# Altium footprint library PcbLib1.PcbLib: 1009 footprints (part 52 of 64)
Each footprint in its own frame and in the unit in brackets; x right, y up, seen from the top. Pads: shape width x height; smd on the part's side, far side on the other; paste and mask are expansions set on the pad; w line width, h text height; cw(c..) or ccw(c..) is an arc to the next point about the centre after c.
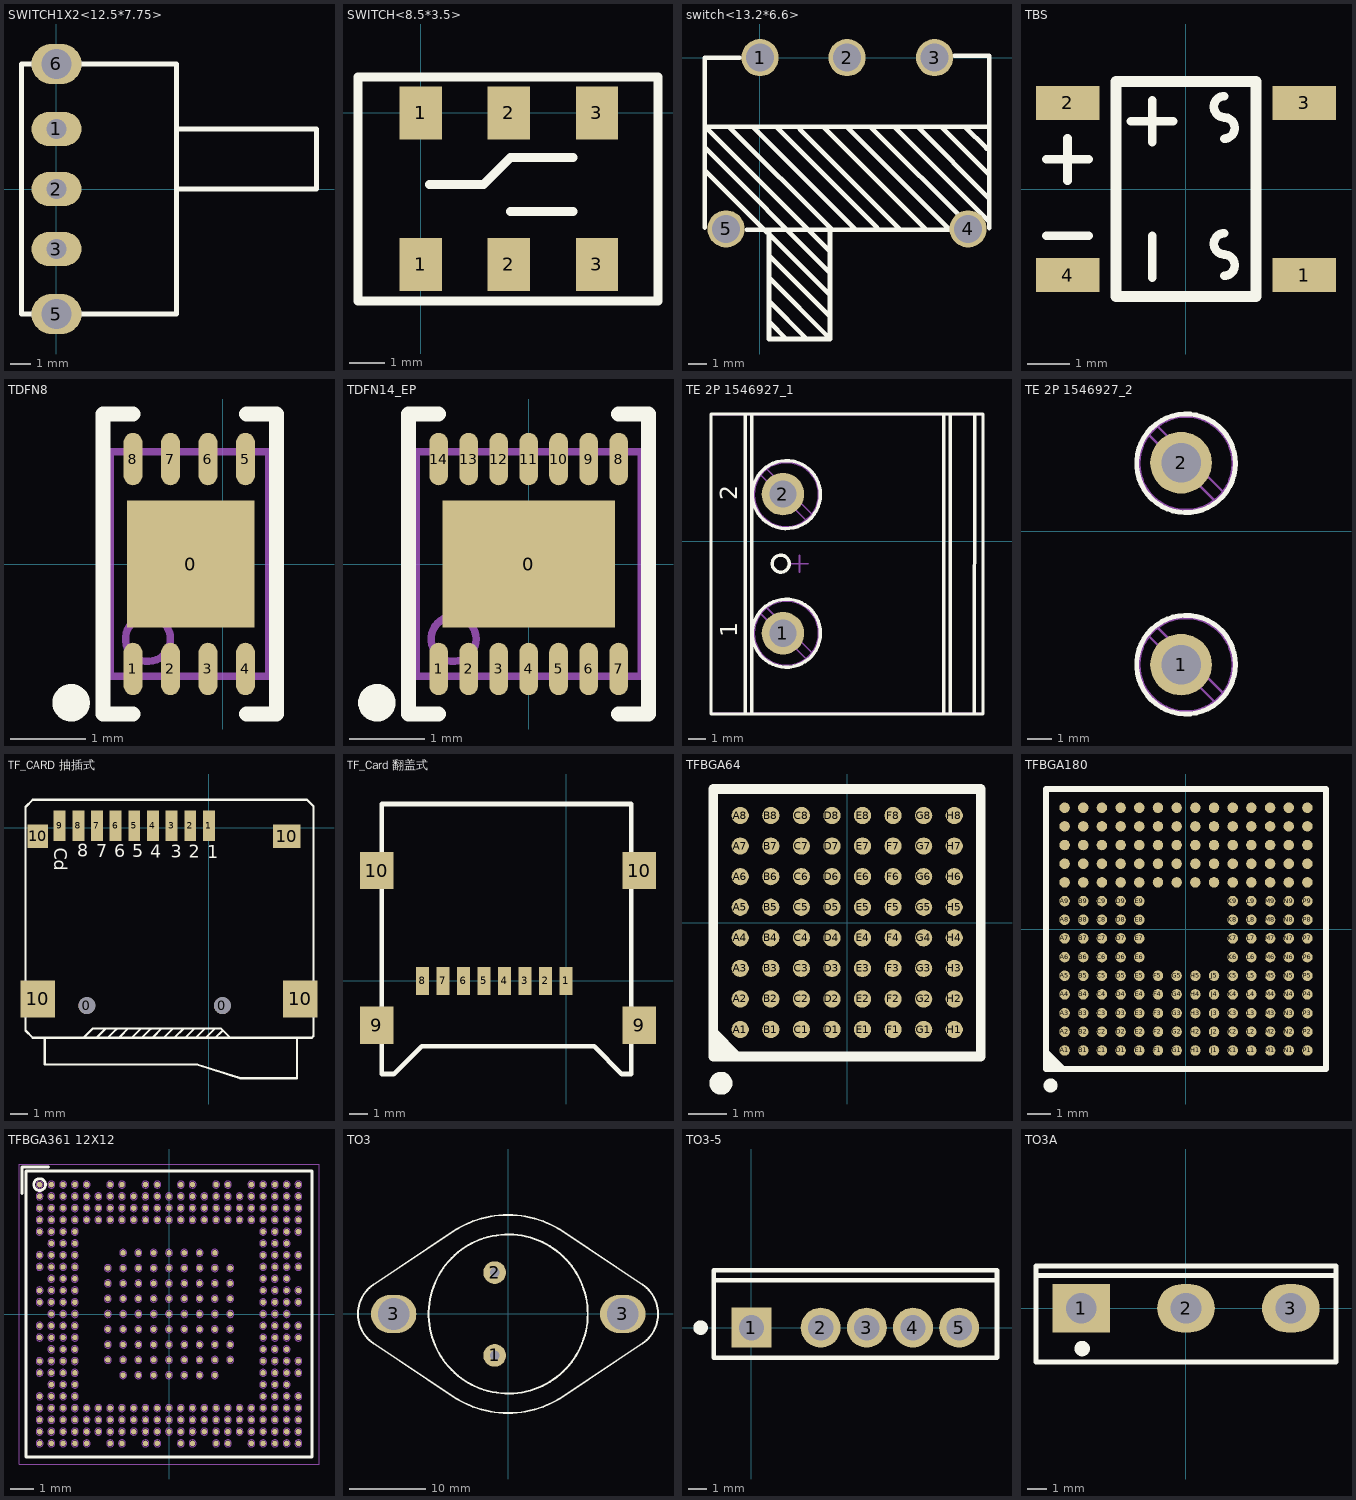
[diagram p51: the footprints below, top view; thin cyan lines are the x and y axes]

## SWITCH1X2<12.5*7.75> [mm]
pads (5):
  oval 2.5x1.7 hole 1: 1(0,3) 2(0,0) 3(0,-3)
  oval 2.5x2 hole 1.5: 5(0,-6.25) 6(0,6.25)
Top Overlay:
  lines w0.254: 6,0 13,0 13,3 6,3 ; -1.75,-6.25 0,-6.25 6,-6.25 6,6.25 0,6.25 -1.5,6.25 -1.75,6.25 -1.75,-6.25
3D body "User Library-SLIDE SWITCH SS12F23.STEP": height 5.75, standoff -3.35, extent -0.608,-6.523 12.292,6.477

## SWITCH<8.5*3.5> [mm]
pads (6):
  rect 1.2x1.5 smd mask+0.051: 1(0,-4.3) 1(0,0) 2(2.5,-4.3) 2(2.5,0) 3(5,-4.3) 3(5,0)
Top Overlay:
  lines w0.254: 0.254,-2.032 1.778,-2.032 2.54,-1.27 4.318,-1.27 ; 2.54,-2.794 4.318,-2.794 ; -1.778,-5.334 -1.778,1.016 6.731,1.016 6.731,-4.826 6.731,-5.334 -1.778,-5.334

## switch<13.2*6.6> [mm]
pads (5):
  round 2 hole 1.5 mask+0.051: 1(0.025,0) 2(4.7,0) 3(9.4,0) 4(11.2,-9.2) 5(-1.8,-9.2)
Top Overlay:
  lines w0.254: -2.946,-9.119 -2.946,0 -1.067,0 ; -2.946,-4.826 3.772,-11.544 ; -2.921,-6.071 3.785,-12.776 ; -2.908,-3.708 3.753,-10.37 ; -2.896,-3.708 12.339,-3.708 12.288,-3.759 ; -1.642,-3.708 3.865,-9.216 ; -0.686,-9.246 10.189,-9.246 ; -0.376,-3.708 5.136,-9.22 ; 0.508,-14.199 1.422,-15.113 ; 0.508,-11.659 0.508,-11.836 3.785,-15.113 ; 0.508,-10.592 0.508,-10.643 3.785,-13.919 ; 0.508,-9.271 0.508,-15.113 3.785,-15.113 ; 0.521,-13.094 2.54,-15.113 ; 0.891,-3.708 6.326,-9.144 ; 2.157,-3.835 7.567,-9.246 ; 3.424,-3.708 8.935,-9.22 ; 3.785,-9.296 3.785,-15.113 ; 4.69,-3.708 10.189,-9.207 ; 5.956,-3.708 11.341,-9.093 ; 7.223,-3.708 12.286,-8.771 ; 8.489,-3.708 12.322,-7.541 ; 9.756,-3.708 12.245,-6.198 ; 10.465,0.102 12.334,0.102 12.339,0.096 12.339,-9.149 ; 11.022,-3.708 12.19,-4.877

## TBS [mm]
pads (4):
  rect 1.5x0.8 smd: 1(2.794,-2.032) 2(-2.794,2.032) 3(2.794,2.032) 4(-2.794,-2.032)
Top Overlay:
  lines w0.203: -3.3,-1.1 -2.3,-1.1 ; -3.3,0.7 -2.3,0.7 ; -2.8,0.2 -2.8,1.2 ; -1.3,1.6 -0.3,1.6 ; -0.8,-2.1 -0.8,-1.1 ; -0.8,1.1 -0.8,2.1 ; 0.9,-2.05 ccw(c0.9,-1.8) 0.9,-1.55 ; 0.9,1.19 ccw(c0.9,1.44) 0.9,1.69 ; 0.908,-1.545 cw(c0.908,-1.295) 0.908,-1.045 ; 0.908,1.695 cw(c0.908,1.945) 0.908,2.195
  lines w0.254: -1.651,-2.54 1.651,-2.54 1.651,2.54 -1.651,2.54 -1.651,-2.54

## TDFN8 [mm]
pads (9):
  rect 1.7x1.7 smd mask+0.051: 0(-0.432,0)
  oval 0.25x0.7 smd mask+0.051: 1(-1.2,-1.4) 2(-0.7,-1.4) 3(-0.2,-1.4) 4(0.3,-1.4) 5(0.3,1.4) 6(-0.2,1.4) 7(-0.7,1.4) 8(-1.2,1.4)
Top Overlay:
  circle w0.25: c-2.025,-1.85 r0.125
  lines w0.2: -1.2,-2 -1.6,-2 -1.6,2 -1.2,2 ; 0.311,-2 0.711,-2 0.711,2 0.311,2
Mechanical 13:
  circle w0.1: c-1,-1 r0.3
  lines w0.1: -1.5,-1.5 0.61,-1.5 0.61,1.5 -1.5,1.5 -1.5,-1.5
3D body "User Library-TDFN-8-1.STEP": height 0.8, standoff 0, extent -1.441,-1.5 0.559,1.5

## TDFN14_EP [mm]
pads (15):
  rect 2.3x1.7 smd mask+0.051: 0(0,0)
  oval 0.25x0.7 smd mask+0.051: 1(-1.2,-1.4) 2(-0.8,-1.4) 3(-0.4,-1.4) 4(0,-1.4) 5(0.4,-1.4) 6(0.8,-1.4) 7(1.2,-1.4) 8(1.2,1.4) 9(0.8,1.4) 10(0.4,1.4) 11(0,1.4) 12(-0.4,1.4) 13(-0.8,1.4) 14(-1.2,1.4)
Top Overlay:
  circle w0.25: c-2.025,-1.85 r0.125
  lines w0.2: -1.2,-2 -1.6,-2 -1.6,2 -1.2,2 ; 1.2,-2 1.6,-2 1.6,2 1.2,2
Mechanical 13:
  circle w0.1: c-1,-1 r0.3
  lines w0.1: -1.5,-1.5 1.5,-1.5 1.5,1.5 -1.5,1.5 -1.5,-1.5

## TE 2P 1546927_1 [mm]
pads (2):
  round 2.5 hole 1.6: 1(10.617,-5.41) 2(10.617,2.769)
Top Overlay:
  circle w0.2: c10.482,-1.321 r0.5
  circle w0.2: c10.817,-5.41 r2
  circle w0.2: c10.817,2.743 r2
  lines w0.2: 6.382,-10.16 6.382,7.48 22.377,7.48 ; 6.401,-10.16 22.38,-10.16 22.38,7.48 ; 8.403,-10.16 8.407,7.468 ; 8.784,-10.135 8.784,7.468 ; 20.063,-10.109 20.063,7.468 ; 20.447,-10.135 20.454,7.468 ; 21.869,-10.135 21.883,7.442
  text "2" at 7.938,2.4 h1
  text "1" at 7.938,-5.645 h1
Mechanical 8:
  lines w0.1: 10.117,-5.41 10.617,-5.41 ; 10.117,2.743 10.617,2.743 ; 10.617,-5.91 10.617,-5.41 ; 10.617,-4.91 10.617,-5.41 ; 10.617,2.243 10.617,2.743 ; 10.617,3.243 10.617,2.743 ; 11.082,-1.321 11.582,-1.321 ; 11.117,-5.41 10.617,-5.41 ; 11.117,2.743 10.617,2.743 ; 11.582,-1.821 11.582,-1.321 ; 11.582,-0.821 11.582,-1.321 ; 12.082,-1.321 11.582,-1.321
Mechanical 14:
  circle w0.1: c10.817,2.743 r2
  circle w0.1: c10.817,-5.41 r2
  circle w0.1: c10.482,-1.321 r0.5
  circle w0.1: c10.817,2.743 r1.891
  circle w0.1: c10.817,-5.41 r1.891
  lines w0.1: 6.382,-10.109 6.382,7.442 22.377,7.442 ; 6.401,-10.109 22.38,-10.109 22.38,7.442 ; 8.403,-10.084 8.407,7.417 ; 8.783,-10.084 8.788,7.442 ; 9.315,-4.261 11.966,-6.913 ; 9.315,3.892 11.966,1.241 ; 9.668,-3.908 12.32,-6.559 ; 9.668,4.246 12.32,1.594 ; 20.063,-10.16 20.063,7.417 ; 20.447,7.417 20.454,-10.135 ; 21.869,7.417 21.883,-10.16
  text "2" at 7.938,2.4 h1
  text "1" at 7.938,-5.645 h1
3D body "c-1546927-2-a-3d.stp": height 14.99, standoff -5.08, extent 6.375,-10.198 22.435,7.506

## TE 2P 1546927_2 [mm]
pads (2):
  round 2.5 hole 1.6: 1(10.617,-5.41) 2(10.617,2.769)
Top Overlay:
  circle w0.2: c10.817,-5.41 r2
  circle w0.2: c10.817,2.743 r2
Mechanical 8:
  lines w0.1: 10.117,-5.41 10.617,-5.41 ; 10.117,2.743 10.617,2.743 ; 10.617,-5.91 10.617,-5.41 ; 10.617,-4.91 10.617,-5.41 ; 10.617,2.243 10.617,2.743 ; 10.617,3.243 10.617,2.743 ; 11.117,-5.41 10.617,-5.41 ; 11.117,2.743 10.617,2.743
Mechanical 14:
  circle w0.1: c10.817,2.743 r2
  circle w0.1: c10.817,-5.41 r2
  circle w0.1: c10.817,2.743 r1.891
  circle w0.1: c10.817,-5.41 r1.891
  lines w0.1: 9.315,-4.261 11.966,-6.913 ; 9.315,3.892 11.966,1.241 ; 9.668,-3.908 12.32,-6.559 ; 9.668,4.246 12.32,1.594

## TF_CARD 抽插式 [mm]
pads (15):
  round 1 hole 1 unplated: 0(-7.2,-10.5) 0(0.8,-10.5)
  rect 0.7x1.8 smd: 1(0,0.127) 2(-1.1,0.127) 3(-2.2,0.127) 4(-3.3,0.127) 5(-4.4,0.127) 6(-5.5,0.127) 7(-6.6,0.127) 8(-7.7,0.127) 9(-8.8,0.127)
  rect 2.032x2.2 smd: 10(-10.1,-10.1) 10(5.4,-10.1)
  rect 1.2x1.4 smd: 10(-10.1,-0.5)
  rect 1.6x1.4 smd: 10(4.6,-0.5)
Top Overlay:
  lines w0.127: -9.677,-12.395 -9.677,-13.97 -0.686,-13.97 ; -6.629,-12.395 -6.096,-11.862 -6.096,-11.836 ; -5.969,-12.395 -5.461,-11.887 -5.461,-11.836 ; -5.232,-12.395 -5.232,-12.319 -4.75,-11.836 ; -4.547,-12.395 -3.988,-11.836 -3.962,-11.836 ; -3.962,-12.395 -3.429,-11.862 -3.429,-11.836 ; -3.327,-12.395 -2.769,-11.836 -2.667,-11.836 ; -2.667,-12.395 -2.108,-11.836 -2.083,-11.836 ; -2.032,-12.395 -1.499,-11.862 -1.499,-11.836 ; -1.397,-12.395 -0.838,-11.836 -0.711,-11.836 ; -0.762,-12.395 -0.203,-11.836 -0.178,-11.836 ; -0.711,-13.97 1.854,-14.783 5.207,-14.783 5.207,-12.421 ; -0.178,-12.395 0.381,-11.836 ; 0.381,-12.395 0.787,-11.989 0.864,-11.989 ; -10.389,-12.395 -10.82,-11.963 -10.82,1.219 -10.389,1.651 5.791,1.651 6.172,1.27 6.172,-12.294 6.071,-12.395 ; -10.389,-12.395 6.071,-12.395 ; -10.389,-12.395 -7.391,-12.395 -6.833,-11.836 0.711,-11.836 1.27,-12.395 6.071,-12.395
  text "Cd" at -9.119,-1.168 h0.76
  text "8" at -7.772,-1.727 h0.76
  text "7" at -6.655,-1.753 h0.76
  text "6" at -5.588,-1.753 h0.76
  text "5" at -4.521,-1.753 h0.76
  text "4" at -3.454,-1.778 h0.76
  text "3" at -2.261,-1.778 h0.76
  text "2" at -1.194,-1.778 h0.76
  text "1" at -0.102,-1.803 h0.76
3D body "sdcard.STEP": height 1.8, standoff -0.7, extent -10.372,-14.725 5.901,0.469

## TF_Card 翻盖式 [mm]
height 2
pads (12):
  rect 0.7x1.5 smd: 1(0,0) 2(-1.1,0) 3(-2.2,0) 4(-3.3,0) 5(-4.4,0) 6(-5.5,0) 7(-6.6,0) 8(-7.7,0)
  rect 1.8x2 smd: 9(-10.168,-2.378) 9(3.932,-2.378) 10(-10.168,5.922) 10(3.932,5.922)
Top Overlay:
  lines w0.254: -9.9,-5 -9.25,-5 -7.75,-3.5 1.5,-3.5 3,-5 3.5,-5 3.5,9.5 0,9.5 -9.9,9.5 -9.9,-5
3D body "User Library-5009010801.STEP": height 1.93, standoff -0.02, extent -10.5,-5 4.1,9.5

## TFBGA64 [mm]
pads (64):
  round 0.45 smd mask+0.051: A1(-2.8,-2.8) A2(-2.8,-2) A3(-2.8,-1.2) A4(-2.8,-0.4) A5(-2.8,0.4) A6(-2.8,1.2) A7(-2.8,2) A8(-2.8,2.8) B1(-2,-2.8) B2(-2,-2) B3(-2,-1.2) B4(-2,-0.4) B5(-2,0.4) B6(-2,1.2) B7(-2,2) B8(-2,2.8) C1(-1.2,-2.8) C2(-1.2,-2) C3(-1.2,-1.2) C4(-1.2,-0.4) C5(-1.2,0.4) C6(-1.2,1.2) C7(-1.2,2) C8(-1.2,2.8) D1(-0.4,-2.8) D2(-0.4,-2) D3(-0.4,-1.2) D4(-0.4,-0.4) D5(-0.4,0.4) D6(-0.4,1.2) D7(-0.4,2) D8(-0.4,2.8) E1(0.4,-2.8) E2(0.4,-2) E3(0.4,-1.2) E4(0.4,-0.4) E5(0.4,0.4) E6(0.4,1.2) E7(0.4,2) E8(0.4,2.8) F1(1.2,-2.8) F2(1.2,-2) F3(1.2,-1.2) F4(1.2,-0.4) F5(1.2,0.4) F6(1.2,1.2) F7(1.2,2) F8(1.2,2.8) G1(2,-2.8) G2(2,-2) G3(2,-1.2) G4(2,-0.4) G5(2,0.4) G6(2,1.2) G7(2,2) G8(2,2.8) H1(2.8,-2.8) H2(2.8,-2) H3(2.8,-1.2) H4(2.8,-0.4) H5(2.8,0.4) H6(2.8,1.2) H7(2.8,2) H8(2.8,2.8)
Top Overlay:
  circle w0.3: c-3.306,-4.206 r0.15
  region: -3.456,-2.756 -2.756,-3.456 -3.456,-3.456
  lines w0.254: -3.506,-3.506 3.494,-3.506 3.494,3.494 -3.506,3.494 -3.506,-3.506

## TFBGA180 [mm]
pads (180):
  round 0.45 smd mask+0.051: A1(-5.2,-5.2) A2(-5.2,-4.4) A3(-5.2,-3.6) A4(-5.2,-2.8) A5(-5.2,-2) A6(-5.2,-1.2) A7(-5.2,-0.4) A8(-5.2,0.4) A9(-5.2,1.2) A10(-5.2,2) A11(-5.2,2.8) A12(-5.2,3.6) A13(-5.2,4.4) A14(-5.2,5.2) B1(-4.4,-5.2) B2(-4.4,-4.4) B3(-4.4,-3.6) B4(-4.4,-2.8) B5(-4.4,-2) B6(-4.4,-1.2) B7(-4.4,-0.4) B8(-4.4,0.4) B9(-4.4,1.2) B10(-4.4,2) B11(-4.4,2.8) B12(-4.4,3.6) B13(-4.4,4.4) B14(-4.4,5.2) C1(-3.6,-5.2) C2(-3.6,-4.4) C3(-3.6,-3.6) C4(-3.6,-2.8) C5(-3.6,-2) C6(-3.6,-1.2) C7(-3.6,-0.4) C8(-3.6,0.4) C9(-3.6,1.2) C10(-3.6,2) C11(-3.6,2.8) C12(-3.6,3.6) C13(-3.6,4.4) C14(-3.6,5.2) D1(-2.8,-5.2) D2(-2.8,-4.4) D3(-2.8,-3.6) D4(-2.8,-2.8) D5(-2.8,-2) D6(-2.8,-1.2) D7(-2.8,-0.4) D8(-2.8,0.4) D9(-2.8,1.2) D10(-2.8,2) D11(-2.8,2.8) D12(-2.8,3.6) D13(-2.8,4.4) D14(-2.8,5.2) E1(-2,-5.2) E2(-2,-4.4) E3(-2,-3.6) E4(-2,-2.8) E5(-2,-2) E6(-2,-1.2) E7(-2,-0.4) E8(-2,0.4) E9(-2,1.2) E10(-2,2) E11(-2,2.8) E12(-2,3.6) E13(-2,4.4) E14(-2,5.2) F1(-1.2,-5.2) F2(-1.2,-4.4) F3(-1.2,-3.6) F4(-1.2,-2.8) F5(-1.2,-2) F10(-1.2,2) F11(-1.2,2.8) F12(-1.2,3.6) F13(-1.2,4.4) F14(-1.2,5.2) G1(-0.4,-5.2) G2(-0.4,-4.4) G3(-0.4,-3.6) G4(-0.4,-2.8) G5(-0.4,-2) G10(-0.4,2) G11(-0.4,2.8) G12(-0.4,3.6) G13(-0.4,4.4) G14(-0.4,5.2) H1(0.4,-5.2) H2(0.4,-4.4) H3(0.4,-3.6) H4(0.4,-2.8) H5(0.4,-2) H10(0.4,2) H11(0.4,2.8) H12(0.4,3.6) H13(0.4,4.4) H14(0.4,5.2) J1(1.2,-5.2) J2(1.2,-4.4) J3(1.2,-3.6) J4(1.2,-2.8) J5(1.2,-2) J10(1.2,2) J11(1.2,2.8) J12(1.2,3.6) J13(1.2,4.4) J14(1.2,5.2) K1(2,-5.2) K2(2,-4.4) K3(2,-3.6) K4(2,-2.8) K5(2,-2) K6(2,-1.2) K7(2,-0.4) K8(2,0.4) K9(2,1.2) K10(2,2) K11(2,2.8) K12(2,3.6) K13(2,4.4) K14(2,5.2) L1(2.8,-5.2) L2(2.8,-4.4) L3(2.8,-3.6) L4(2.8,-2.8) L5(2.8,-2) L6(2.8,-1.2) L7(2.8,-0.4) L8(2.8,0.4) L9(2.8,1.2) L10(2.8,2) L11(2.8,2.8) L12(2.8,3.6) L13(2.8,4.4) L14(2.8,5.2) M1(3.6,-5.2) M2(3.6,-4.4) M3(3.6,-3.6) M4(3.6,-2.8) M5(3.6,-2) M6(3.6,-1.2) M7(3.6,-0.4) M8(3.6,0.4) M9(3.6,1.2) M10(3.6,2) M11(3.6,2.8) M12(3.6,3.6) M13(3.6,4.4) M14(3.6,5.2) N1(4.4,-5.2) N2(4.4,-4.4) N3(4.4,-3.6) N4(4.4,-2.8) N5(4.4,-2) N6(4.4,-1.2) N7(4.4,-0.4) N8(4.4,0.4) N9(4.4,1.2) N10(4.4,2) N11(4.4,2.8) N12(4.4,3.6) N13(4.4,4.4) N14(4.4,5.2) P1(5.2,-5.2) P2(5.2,-4.4) P3(5.2,-3.6) P4(5.2,-2.8) P5(5.2,-2) P6(5.2,-1.2) P7(5.2,-0.4) P8(5.2,0.4) P9(5.2,1.2) P10(5.2,2) P11(5.2,2.8) P12(5.2,3.6) P13(5.2,4.4) P14(5.2,5.2)
Top Overlay:
  circle w0.3: c-5.8,-6.7 r0.15
  region: -5.95,-5.15 -5.15,-5.95 -5.95,-5.95
  lines w0.254: -6,-6 6,-6 6,6 -6,6 -6,-6

## TFBGA361 12X12 [mm]
pads (361):
  round 0.23 smd mask+0.05: 1A2(-1.95,2.6) 1A3(-1.3,2.6) 1A4(-0.65,2.6) 1A5(0,2.6) 1A6(0.65,2.6) 1A7(1.3,2.6) 1A8(1.95,2.6) 1B1(-2.6,1.95) 1B2(-1.95,1.95) 1B3(-1.3,1.95) 1B4(-0.65,1.95) 1B5(0,1.95) 1B6(0.65,1.95) 1B7(1.3,1.95) 1B8(1.95,1.95) 1B9(2.6,1.95) 1C1(-2.6,1.3) 1C2(-1.95,1.3) 1C3(-1.3,1.3) 1C4(-0.65,1.3) 1C5(0,1.3) 1C6(0.65,1.3) 1C7(1.3,1.3) 1C8(1.95,1.3) 1C9(2.6,1.3) 1D1(-2.6,0.65) 1D2(-1.95,0.65) 1D3(-1.3,0.65) 1D4(-0.65,0.65) 1D5(0,0.65) 1D6(0.65,0.65) 1D7(1.3,0.65) 1D8(1.95,0.65) 1D9(2.6,0.65) 1E1(-2.6,0) 1E2(-1.95,0) 1E3(-1.3,0) 1E4(-0.65,0) 1E5(0,0) 1E6(0.65,0) 1E7(1.3,0) 1E8(1.95,0) 1E9(2.6,0) 1F1(-2.6,-0.65) 1F2(-1.95,-0.65) 1F3(-1.3,-0.65) 1F4(-0.65,-0.65) 1F5(0,-0.65) 1F6(0.65,-0.65) 1F7(1.3,-0.65) 1F8(1.95,-0.65) 1F9(2.6,-0.65) 1G1(-2.6,-1.3) 1G2(-1.95,-1.3) 1G3(-1.3,-1.3) 1G4(-0.65,-1.3) 1G5(0,-1.3) 1G6(0.65,-1.3) 1G7(1.3,-1.3) 1G8(1.95,-1.3) 1G9(2.6,-1.3) 1H1(-2.6,-1.95) 1H2(-1.95,-1.95) 1H3(-1.3,-1.95) 1H4(-0.65,-1.95) 1H5(0,-1.95) 1H6(0.65,-1.95) 1H7(1.3,-1.95) 1H8(1.95,-1.95) 1H9(2.6,-1.95) 1J2(-1.95,-2.6) 1J3(-1.3,-2.6) 1J4(-0.65,-2.6) 1J5(0,-2.6) 1J6(0.65,-2.6) 1J7(1.3,-2.6) 1J8(1.95,-2.6) A1(-5.5,5.5) A2(-5,5.5) A3(-4.5,5.5) A4(-4,5.5) A5(-3.5,5.5) A7(-2.5,5.5) A8(-2,5.5) A10(-1,5.5) A11(-0.5,5.5) A13(0.5,5.5) A14(1,5.5) A16(2,5.5) A17(2.5,5.5) A19(3.5,5.5) A20(4,5.5) A21(4.5,5.5) A22(5,5.5) A23(5.5,5.5) AA1(-5.5,-4.5) AA2(-5,-4.5) AA3(-4.5,-4.5) AA4(-4,-4.5) AA5(-3.5,-4.5) AA6(-3,-4.5) AA7(-2.5,-4.5) AA8(-2,-4.5) AA9(-1.5,-4.5) AA10(-1,-4.5) AA11(-0.5,-4.5) AA12(0,-4.5) AA13(0.5,-4.5) AA14(1,-4.5) AA15(1.5,-4.5) AA16(2,-4.5) AA17(2.5,-4.5) AA18(3,-4.5) AA19(3.5,-4.5) AA20(4,-4.5) AA21(4.5,-4.5) AA22(5,-4.5) AA23(5.5,-4.5) AB1(-5.5,-5) AB2(-5,-5) AB3(-4.5,-5) AB4(-4,-5) AB5(-3.5,-5) AB6(-3,-5) AB7(-2.5,-5) AB8(-2,-5) AB9(-1.5,-5) AB10(-1,-5) AB11(-0.5,-5) AB12(0,-5) AB13(0.5,-5) AB14(1,-5) AB15(1.5,-5) AB16(2,-5) AB17(2.5,-5) AB18(3,-5) AB19(3.5,-5) AB20(4,-5) AB21(4.5,-5) AB22(5,-5) AB23(5.5,-5) AC1(-5.5,-5.5) AC2(-5,-5.5) AC3(-4.5,-5.5) AC4(-4,-5.5) AC5(-3.5,-5.5) AC7(-2.5,-5.5) AC8(-2,-5.5) AC10(-1,-5.5) AC11(-0.5,-5.5) AC13(0.5,-5.5) AC14(1,-5.5) AC16(2,-5.5) AC17(2.5,-5.5) AC19(3.5,-5.5) AC20(4,-5.5) AC21(4.5,-5.5) AC22(5,-5.5) AC23(5.5,-5.5) B1(-5.5,5) B2(-5,5) B3(-4.5,5) B4(-4,5) B5(-3.5,5) B6(-3,5) B7(-2.5,5) B8(-2,5) B9(-1.5,5) B10(-1,5) B11(-0.5,5) B12(0,5) B13(0.5,5) B14(1,5) B15(1.5,5) B16(2,5) B17(2.5,5) B18(3,5) B19(3.5,5) B20(4,5) B21(4.5,5) B22(5,5) B23(5.5,5) C1(-5.5,4.5) C2(-5,4.5) C3(-4.5,4.5) C4(-4,4.5) C5(-3.5,4.5) C6(-3,4.5) C7(-2.5,4.5) C8(-2,4.5) C9(-1.5,4.5) C10(-1,4.5) C11(-0.5,4.5) C12(0,4.5) C13(0.5,4.5) C14(1,4.5) C15(1.5,4.5) C16(2,4.5) C17(2.5,4.5) C18(3,4.5) C19(3.5,4.5) C20(4,4.5) C21(4.5,4.5) C22(5,4.5) C23(5.5,4.5) D1(-5.5,4) D2(-5,4) D3(-4.5,4) D4(-4,4) D5(-3.5,4) D6(-3,4) D7(-2.5,4) D8(-2,4) D9(-1.5,4) D10(-1,4) D11(-0.5,4) D12(0,4) D13(0.5,4) D14(1,4) D15(1.5,4) D16(2,4) D17(2.5,4) D18(3,4) D19(3.5,4) D20(4,4) D21(4.5,4) D22(5,4) D23(5.5,4) E1(-5.5,3.5) E2(-5,3.5) E3(-4.5,3.5) E4(-4,3.5) E20(4,3.5) E21(4.5,3.5) E22(5,3.5) E23(5.5,3.5) F2(-5,3) F3(-4.5,3) F4(-4,3) F20(4,3) F21(4.5,3) F22(5,3) G1(-5.5,2.5) G2(-5,2.5) G3(-4.5,2.5) G4(-4,2.5) G20(4,2.5) G21(4.5,2.5) G22(5,2.5) G23(5.5,2.5) H1(-5.5,2) H2(-5,2) H3(-4.5,2) H4(-4,2) H20(4,2) H21(4.5,2) H22(5,2) H23(5.5,2) J2(-5,1.5) J3(-4.5,1.5) J4(-4,1.5) J20(4,1.5) J21(4.5,1.5) J22(5,1.5) K1(-5.5,1) K2(-5,1) K3(-4.5,1) K4(-4,1) K20(4,1) K21(4.5,1) K22(5,1) K23(5.5,1) L1(-5.5,0.5) L2(-5,0.5) L3(-4.5,0.5) L4(-4,0.5) L20(4,0.5) L21(4.5,0.5) L22(5,0.5) L23(5.5,0.5) M2(-5,0) M3(-4.5,0) M4(-4,0) M20(4,0) M21(4.5,0) M22(5,0) N1(-5.5,-0.5) N2(-5,-0.5) N3(-4.5,-0.5) N4(-4,-0.5) N20(4,-0.5) N21(4.5,-0.5) N22(5,-0.5) N23(5.5,-0.5) P1(-5.5,-1) P2(-5,-1) P3(-4.5,-1) P4(-4,-1) P20(4,-1) P21(4.5,-1) P22(5,-1) P23(5.5,-1) R2(-5,-1.5) R3(-4.5,-1.5) R4(-4,-1.5) R20(4,-1.5) R21(4.5,-1.5) R22(5,-1.5) T1(-5.5,-2) T2(-5,-2) T3(-4.5,-2) T4(-4,-2) T20(4,-2) T21(4.5,-2) T22(5,-2) T23(5.5,-2) U1(-5.5,-2.5) U2(-5,-2.5) U3(-4.5,-2.5) U4(-4,-2.5) U20(4,-2.5) U21(4.5,-2.5) U22(5,-2.5) U23(5.5,-2.5) V2(-5,-3) V3(-4.5,-3) V4(-4,-3) V20(4,-3) V21(4.5,-3) V22(5,-3) W1(-5.5,-3.5) W2(-5,-3.5) W3(-4.5,-3.5) W4(-4,-3.5) W20(4,-3.5) W21(4.5,-3.5) W22(5,-3.5) W23(5.5,-3.5) Y1(-5.5,-4) Y2(-5,-4) Y3(-4.5,-4) Y4(-4,-4) Y5(-3.5,-4) Y6(-3,-4) Y7(-2.5,-4) Y8(-2,-4) Y9(-1.5,-4) Y10(-1,-4) Y11(-0.5,-4) Y12(0,-4) Y13(0.5,-4) Y14(1,-4) Y15(1.5,-4) Y16(2,-4) Y17(2.5,-4) Y18(3,-4) Y19(3.5,-4) Y20(4,-4) Y21(4.5,-4) Y22(5,-4) Y23(5.5,-4)
Top Overlay:
  circle w0.12: c-5.5,5.5 r0.251
  lines w0.12: -6.25,5.125 -6.25,6.25 -5.125,6.25 ; -6.075,-6.075 6.075,-6.075 6.075,6.075 -6.075,6.075 -6.075,-6.075
Mechanical 14:
  drawing of 365 lines, arcs and shapes, not listed
  text "'.Designator'" at -2,-0.5 h0.75
  text "A1" at -5.725,5.35 h0.5
  text "1A2" at -2.3,2.45 h0.5
Mechanical 16:
  lines w0.01: -6.375,-6.375 -6.375,6.375 5.9,6.375 6.375,6.375 6.375,-6.375 -6.375,-6.375
3D body: height 0.26, standoff -0.04, extent -0.141,-0.148 0.15,0.148
3D body: height 0.26, standoff -0.04, extent -2.741,-0.148 -2.45,0.148
3D body: height 0.26, standoff -0.04, extent -2.091,-0.148 -1.8,0.148
3D body: height 0.26, standoff -0.04, extent -1.441,-0.148 -1.15,0.148
3D body: height 0.26, standoff -0.04, extent -0.791,-0.148 -0.5,0.148
3D body: height 0.26, standoff -0.04, extent 0.509,-0.148 0.8,0.148
3D body: height 0.26, standoff -0.04, extent 1.159,-0.148 1.45,0.148
3D body: height 0.26, standoff -0.04, extent 1.809,-0.148 2.1,0.148
3D body: height 0.26, standoff -0.04, extent 2.459,-0.148 2.75,0.148
3D body: height 0.26, standoff -0.04, extent 2.459,0.502 2.75,0.798
3D body: height 0.26, standoff -0.04, extent 1.809,0.502 2.1,0.798
3D body: height 0.26, standoff -0.04, extent 1.159,0.502 1.45,0.798
3D body: height 0.26, standoff -0.04, extent 0.509,0.502 0.8,0.798
3D body: height 0.26, standoff -0.04, extent -0.791,0.502 -0.5,0.798
3D body: height 0.26, standoff -0.04, extent -1.441,0.502 -1.15,0.798
3D body: height 0.26, standoff -0.04, extent -2.091,0.502 -1.8,0.798
3D body: height 0.26, standoff -0.04, extent -2.741,0.502 -2.45,0.798
3D body: height 0.26, standoff -0.04, extent -0.141,0.502 0.15,0.798
3D body: height 0.26, standoff -0.04, extent 2.459,1.152 2.75,1.448
3D body: height 0.26, standoff -0.04, extent 1.809,1.152 2.1,1.448
3D body: height 0.26, standoff -0.04, extent 1.159,1.152 1.45,1.448
3D body: height 0.26, standoff -0.04, extent 0.509,1.152 0.8,1.448
3D body: height 0.26, standoff -0.04, extent -0.791,1.152 -0.5,1.448
3D body: height 0.26, standoff -0.04, extent -1.441,1.152 -1.15,1.448
3D body: height 0.26, standoff -0.04, extent -2.091,1.152 -1.8,1.448
3D body: height 0.26, standoff -0.04, extent -2.741,1.152 -2.45,1.448
3D body: height 0.26, standoff -0.04, extent -0.141,1.152 0.15,1.448
3D body: height 0.26, standoff -0.04, extent 2.459,1.802 2.75,2.098
3D body: height 0.26, standoff -0.04, extent 1.809,1.802 2.1,2.098
3D body: height 0.26, standoff -0.04, extent 1.159,1.802 1.45,2.098
3D body: height 0.26, standoff -0.04, extent 0.509,1.802 0.8,2.098
3D body: height 0.26, standoff -0.04, extent -0.791,1.802 -0.5,2.098
3D body: height 0.26, standoff -0.04, extent -1.441,1.802 -1.15,2.098
3D body: height 0.26, standoff -0.04, extent -2.091,1.802 -1.8,2.098
3D body: height 0.26, standoff -0.04, extent -2.741,1.802 -2.45,2.098
3D body: height 0.26, standoff -0.04, extent -0.141,1.802 0.15,2.098
3D body: height 0.26, standoff -0.04, extent 1.809,2.452 2.1,2.748
3D body: height 0.26, standoff -0.04, extent 1.159,2.452 1.45,2.748
3D body: height 0.26, standoff -0.04, extent 0.509,2.452 0.8,2.748
3D body: height 0.26, standoff -0.04, extent -0.791,2.452 -0.5,2.748
3D body: height 0.26, standoff -0.04, extent -1.441,2.452 -1.15,2.748
3D body: height 0.26, standoff -0.04, extent -2.091,2.452 -1.8,2.748
3D body: height 0.26, standoff -0.04, extent -0.141,2.452 0.15,2.748
3D body: height 0.26, standoff -0.04, extent 2.459,-0.798 2.75,-0.502
3D body: height 0.26, standoff -0.04, extent 1.809,-0.798 2.1,-0.502
3D body: height 0.26, standoff -0.04, extent 1.159,-0.798 1.45,-0.502
3D body: height 0.26, standoff -0.04, extent 0.509,-0.798 0.8,-0.502
3D body: height 0.26, standoff -0.04, extent -0.791,-0.798 -0.5,-0.502
3D body: height 0.26, standoff -0.04, extent -1.441,-0.798 -1.15,-0.502
3D body: height 0.26, standoff -0.04, extent -2.091,-0.798 -1.8,-0.502
3D body: height 0.26, standoff -0.04, extent -2.741,-0.798 -2.45,-0.502
3D body: height 0.26, standoff -0.04, extent -0.141,-0.798 0.15,-0.502
3D body: height 0.26, standoff -0.04, extent 2.459,-1.448 2.75,-1.152
3D body: height 0.26, standoff -0.04, extent 1.809,-1.448 2.1,-1.152
3D body: height 0.26, standoff -0.04, extent 1.159,-1.448 1.45,-1.152
3D body: height 0.26, standoff -0.04, extent 0.509,-1.448 0.8,-1.152
3D body: height 0.26, standoff -0.04, extent -0.791,-1.448 -0.5,-1.152
3D body: height 0.26, standoff -0.04, extent -1.441,-1.448 -1.15,-1.152
3D body: height 0.26, standoff -0.04, extent -2.091,-1.448 -1.8,-1.152
3D body: height 0.26, standoff -0.04, extent -2.741,-1.448 -2.45,-1.152
3D body: height 0.26, standoff -0.04, extent -0.141,-1.448 0.15,-1.152
3D body: height 0.26, standoff -0.04, extent 2.459,-2.098 2.75,-1.802
3D body: height 0.26, standoff -0.04, extent 1.809,-2.098 2.1,-1.802
3D body: height 0.26, standoff -0.04, extent 1.159,-2.098 1.45,-1.802
3D body: height 0.26, standoff -0.04, extent 0.509,-2.098 0.8,-1.802
3D body: height 0.26, standoff -0.04, extent -0.791,-2.098 -0.5,-1.802
3D body: height 0.26, standoff -0.04, extent -1.441,-2.098 -1.15,-1.802
3D body: height 0.26, standoff -0.04, extent -2.091,-2.098 -1.8,-1.802
3D body: height 0.26, standoff -0.04, extent -2.741,-2.098 -2.45,-1.802
3D body: height 0.26, standoff -0.04, extent -0.141,-2.098 0.15,-1.802
3D body: height 0.26, standoff -0.04, extent 1.809,-2.748 2.1,-2.452
3D body: height 0.26, standoff -0.04, extent 1.159,-2.748 1.45,-2.452
3D body: height 0.26, standoff -0.04, extent 0.509,-2.748 0.8,-2.452
3D body: height 0.26, standoff -0.04, extent -0.791,-2.748 -0.5,-2.452
3D body: height 0.26, standoff -0.04, extent -1.441,-2.748 -1.15,-2.452
3D body: height 0.26, standoff -0.04, extent -2.091,-2.748 -1.8,-2.452
3D body: height 0.26, standoff -0.04, extent -0.141,-2.748 0.15,-2.452
3D body: height 0.26, standoff -0.04, extent -5.641,5.352 -5.35,5.648
3D body: height 0.26, standoff -0.04, extent -5.141,5.352 -4.85,5.648
3D body: height 0.26, standoff -0.04, extent -4.641,5.352 -4.35,5.648
3D body: height 0.26, standoff -0.04, extent -4.141,5.352 -3.85,5.648
3D body: height 0.26, standoff -0.04, extent -3.641,5.352 -3.35,5.648
3D body: height 0.26, standoff -0.04, extent -2.641,5.352 -2.35,5.648
3D body: height 0.26, standoff -0.04, extent -2.141,5.352 -1.85,5.648
3D body: height 0.26, standoff -0.04, extent -1.141,5.352 -0.85,5.648
3D body: height 0.26, standoff -0.04, extent -0.641,5.352 -0.35,5.648
3D body: height 0.26, standoff -0.04, extent 0.359,5.352 0.65,5.648
3D body: height 0.26, standoff -0.04, extent 0.859,5.352 1.15,5.648
3D body: height 0.26, standoff -0.04, extent 1.859,5.352 2.15,5.648
3D body: height 0.26, standoff -0.04, extent 2.359,5.352 2.65,5.648
3D body: height 0.26, standoff -0.04, extent 3.359,5.352 3.65,5.648
3D body: height 0.26, standoff -0.04, extent 3.859,5.352 4.15,5.648
3D body: height 0.26, standoff -0.04, extent 4.359,5.352 4.65,5.648
3D body: height 0.26, standoff -0.04, extent 4.859,5.352 5.15,5.648
3D body: height 0.26, standoff -0.04, extent 5.359,5.352 5.65,5.648
3D body: height 0.26, standoff -0.04, extent 5.359,4.852 5.65,5.148
3D body: height 0.26, standoff -0.04, extent 4.859,4.852 5.15,5.148
3D body: height 0.26, standoff -0.04, extent 4.359,4.852 4.65,5.148
3D body: height 0.26, standoff -0.04, extent 3.859,4.852 4.15,5.148
3D body: height 0.26, standoff -0.04, extent 3.359,4.852 3.65,5.148
3D body: height 0.26, standoff -0.04, extent 2.859,4.852 3.15,5.148
3D body: height 0.26, standoff -0.04, extent 2.359,4.852 2.65,5.148
3D body: height 0.26, standoff -0.04, extent 1.859,4.852 2.15,5.148
3D body: height 0.26, standoff -0.04, extent 1.359,4.852 1.65,5.148
3D body: height 0.26, standoff -0.04, extent 0.859,4.852 1.15,5.148
3D body: height 0.26, standoff -0.04, extent 0.359,4.852 0.65,5.148
3D body: height 0.26, standoff -0.04, extent -0.141,4.852 0.15,5.148
3D body: height 0.26, standoff -0.04, extent -0.641,4.852 -0.35,5.148
3D body: height 0.26, standoff -0.04, extent -1.141,4.852 -0.85,5.148
3D body: height 0.26, standoff -0.04, extent -1.641,4.852 -1.35,5.148
3D body: height 0.26, standoff -0.04, extent -2.141,4.852 -1.85,5.148
3D body: height 0.26, standoff -0.04, extent -2.641,4.852 -2.35,5.148
3D body: height 0.26, standoff -0.04, extent -3.141,4.852 -2.85,5.148
3D body: height 0.26, standoff -0.04, extent -3.641,4.852 -3.35,5.148
3D body: height 0.26, standoff -0.04, extent -4.141,4.852 -3.85,5.148
3D body: height 0.26, standoff -0.04, extent -4.641,4.852 -4.35,5.148
3D body: height 0.26, standoff -0.04, extent -5.141,4.852 -4.85,5.148
3D body: height 0.26, standoff -0.04, extent -5.641,4.852 -5.35,5.148
3D body: height 0.26, standoff -0.04, extent 5.359,4.352 5.65,4.648
3D body: height 0.26, standoff -0.04, extent 4.859,4.352 5.15,4.648
3D body: height 0.26, standoff -0.04, extent 4.359,4.352 4.65,4.648
3D body: height 0.26, standoff -0.04, extent 3.859,4.352 4.15,4.648
3D body: height 0.26, standoff -0.04, extent 3.359,4.352 3.65,4.648
3D body: height 0.26, standoff -0.04, extent 2.859,4.352 3.15,4.648
3D body: height 0.26, standoff -0.04, extent 2.359,4.352 2.65,4.648
3D body: height 0.26, standoff -0.04, extent 1.859,4.352 2.15,4.648
3D body: height 0.26, standoff -0.04, extent 1.359,4.352 1.65,4.648
3D body: height 0.26, standoff -0.04, extent 0.859,4.352 1.15,4.648
3D body: height 0.26, standoff -0.04, extent 0.359,4.352 0.65,4.648
3D body: height 0.26, standoff -0.04, extent -0.141,4.352 0.15,4.648
3D body: height 0.26, standoff -0.04, extent -0.641,4.352 -0.35,4.648
3D body: height 0.26, standoff -0.04, extent -1.141,4.352 -0.85,4.648
3D body: height 0.26, standoff -0.04, extent -1.641,4.352 -1.35,4.648
3D body: height 0.26, standoff -0.04, extent -2.141,4.352 -1.85,4.648
3D body: height 0.26, standoff -0.04, extent -2.641,4.352 -2.35,4.648
3D body: height 0.26, standoff -0.04, extent -3.141,4.352 -2.85,4.648
3D body: height 0.26, standoff -0.04, extent -3.641,4.352 -3.35,4.648
3D body: height 0.26, standoff -0.04, extent -4.141,4.352 -3.85,4.648
3D body: height 0.26, standoff -0.04, extent -4.641,4.352 -4.35,4.648
3D body: height 0.26, standoff -0.04, extent -5.141,4.352 -4.85,4.648
3D body: height 0.26, standoff -0.04, extent -5.641,4.352 -5.35,4.648
3D body: height 0.26, standoff -0.04, extent 5.359,3.852 5.65,4.148
3D body: height 0.26, standoff -0.04, extent 4.859,3.852 5.15,4.148
3D body: height 0.26, standoff -0.04, extent 4.359,3.852 4.65,4.148
3D body: height 0.26, standoff -0.04, extent 3.859,3.852 4.15,4.148
3D body: height 0.26, standoff -0.04, extent 3.359,3.852 3.65,4.148
3D body: height 0.26, standoff -0.04, extent 2.859,3.852 3.15,4.148
3D body: height 0.26, standoff -0.04, extent 2.359,3.852 2.65,4.148
3D body: height 0.26, standoff -0.04, extent 1.859,3.852 2.15,4.148
3D body: height 0.26, standoff -0.04, extent 1.359,3.852 1.65,4.148
3D body: height 0.26, standoff -0.04, extent 0.859,3.852 1.15,4.148
3D body: height 0.26, standoff -0.04, extent 0.359,3.852 0.65,4.148
3D body: height 0.26, standoff -0.04, extent -0.141,3.852 0.15,4.148
3D body: height 0.26, standoff -0.04, extent -0.641,3.852 -0.35,4.148
3D body: height 0.26, standoff -0.04, extent -1.141,3.852 -0.85,4.148
3D body: height 0.26, standoff -0.04, extent -1.641,3.852 -1.35,4.148
3D body: height 0.26, standoff -0.04, extent -2.141,3.852 -1.85,4.148
3D body: height 0.26, standoff -0.04, extent -2.641,3.852 -2.35,4.148
3D body: height 0.26, standoff -0.04, extent -3.141,3.852 -2.85,4.148
3D body: height 0.26, standoff -0.04, extent -3.641,3.852 -3.35,4.148
3D body: height 0.26, standoff -0.04, extent -4.141,3.852 -3.85,4.148
3D body: height 0.26, standoff -0.04, extent -4.641,3.852 -4.35,4.148
3D body: height 0.26, standoff -0.04, extent -5.141,3.852 -4.85,4.148
3D body: height 0.26, standoff -0.04, extent -5.641,3.852 -5.35,4.148
3D body: height 0.26, standoff -0.04, extent 5.359,-4.148 5.65,-3.852
3D body: height 0.26, standoff -0.04, extent 4.859,-4.148 5.15,-3.852
3D body: height 0.26, standoff -0.04, extent 4.359,-4.148 4.65,-3.852
3D body: height 0.26, standoff -0.04, extent 3.859,-4.148 4.15,-3.852
3D body: height 0.26, standoff -0.04, extent 3.359,-4.148 3.65,-3.852
3D body: height 0.26, standoff -0.04, extent 2.859,-4.148 3.15,-3.852
3D body: height 0.26, standoff -0.04, extent 2.359,-4.148 2.65,-3.852
3D body: height 0.26, standoff -0.04, extent 1.859,-4.148 2.15,-3.852
3D body: height 0.26, standoff -0.04, extent 1.359,-4.148 1.65,-3.852
3D body: height 0.26, standoff -0.04, extent 0.859,-4.148 1.15,-3.852
3D body: height 0.26, standoff -0.04, extent 0.359,-4.148 0.65,-3.852
3D body: height 0.26, standoff -0.04, extent -0.141,-4.148 0.15,-3.852
3D body: height 0.26, standoff -0.04, extent -0.641,-4.148 -0.35,-3.852
3D body: height 0.26, standoff -0.04, extent -1.141,-4.148 -0.85,-3.852
3D body: height 0.26, standoff -0.04, extent -1.641,-4.148 -1.35,-3.852
3D body: height 0.26, standoff -0.04, extent -2.141,-4.148 -1.85,-3.852
3D body: height 0.26, standoff -0.04, extent -2.641,-4.148 -2.35,-3.852
3D body: height 0.26, standoff -0.04, extent -3.141,-4.148 -2.85,-3.852
3D body: height 0.26, standoff -0.04, extent -3.641,-4.148 -3.35,-3.852
3D body: height 0.26, standoff -0.04, extent -4.141,-4.148 -3.85,-3.852
3D body: height 0.26, standoff -0.04, extent -4.641,-4.148 -4.35,-3.852
3D body: height 0.26, standoff -0.04, extent -5.141,-4.148 -4.85,-3.852
3D body: height 0.26, standoff -0.04, extent -5.641,-4.148 -5.35,-3.852
3D body: height 0.26, standoff -0.04, extent 5.359,-4.648 5.65,-4.352
3D body: height 0.26, standoff -0.04, extent 4.859,-4.648 5.15,-4.352
3D body: height 0.26, standoff -0.04, extent 4.359,-4.648 4.65,-4.352
3D body: height 0.26, standoff -0.04, extent 3.859,-4.648 4.15,-4.352
3D body: height 0.26, standoff -0.04, extent 3.359,-4.648 3.65,-4.352
3D body: height 0.26, standoff -0.04, extent 2.859,-4.648 3.15,-4.352
3D body: height 0.26, standoff -0.04, extent 2.359,-4.648 2.65,-4.352
3D body: height 0.26, standoff -0.04, extent 1.859,-4.648 2.15,-4.352
3D body: height 0.26, standoff -0.04, extent 1.359,-4.648 1.65,-4.352
3D body: height 0.26, standoff -0.04, extent 0.859,-4.648 1.15,-4.352
3D body: height 0.26, standoff -0.04, extent 0.359,-4.648 0.65,-4.352
3D body: height 0.26, standoff -0.04, extent -0.141,-4.648 0.15,-4.352
3D body: height 0.26, standoff -0.04, extent -0.641,-4.648 -0.35,-4.352
3D body: height 0.26, standoff -0.04, extent -1.141,-4.648 -0.85,-4.352
3D body: height 0.26, standoff -0.04, extent -1.641,-4.648 -1.35,-4.352
3D body: height 0.26, standoff -0.04, extent -2.141,-4.648 -1.85,-4.352
3D body: height 0.26, standoff -0.04, extent -2.641,-4.648 -2.35,-4.352
3D body: height 0.26, standoff -0.04, extent -3.141,-4.648 -2.85,-4.352
3D body: height 0.26, standoff -0.04, extent -3.641,-4.648 -3.35,-4.352
3D body: height 0.26, standoff -0.04, extent -4.141,-4.648 -3.85,-4.352
3D body: height 0.26, standoff -0.04, extent -4.641,-4.648 -4.35,-4.352
3D body: height 0.26, standoff -0.04, extent -5.141,-4.648 -4.85,-4.352
3D body: height 0.26, standoff -0.04, extent -5.641,-4.648 -5.35,-4.352
3D body: height 0.26, standoff -0.04, extent 5.359,-5.148 5.65,-4.852
3D body: height 0.26, standoff -0.04, extent 4.859,-5.148 5.15,-4.852
3D body: height 0.26, standoff -0.04, extent 4.359,-5.148 4.65,-4.852
3D body: height 0.26, standoff -0.04, extent 3.859,-5.148 4.15,-4.852
3D body: height 0.26, standoff -0.04, extent 3.359,-5.148 3.65,-4.852
3D body: height 0.26, standoff -0.04, extent 2.859,-5.148 3.15,-4.852
3D body: height 0.26, standoff -0.04, extent 2.359,-5.148 2.65,-4.852
3D body: height 0.26, standoff -0.04, extent 1.859,-5.148 2.15,-4.852
3D body: height 0.26, standoff -0.04, extent 1.359,-5.148 1.65,-4.852
3D body: height 0.26, standoff -0.04, extent 0.859,-5.148 1.15,-4.852
3D body: height 0.26, standoff -0.04, extent 0.359,-5.148 0.65,-4.852
3D body: height 0.26, standoff -0.04, extent -0.141,-5.148 0.15,-4.852
3D body: height 0.26, standoff -0.04, extent -0.641,-5.148 -0.35,-4.852
3D body: height 0.26, standoff -0.04, extent -1.141,-5.148 -0.85,-4.852
3D body: height 0.26, standoff -0.04, extent -1.641,-5.148 -1.35,-4.852
3D body: height 0.26, standoff -0.04, extent -2.141,-5.148 -1.85,-4.852
3D body: height 0.26, standoff -0.04, extent -2.641,-5.148 -2.35,-4.852
3D body: height 0.26, standoff -0.04, extent -3.141,-5.148 -2.85,-4.852
3D body: height 0.26, standoff -0.04, extent -3.641,-5.148 -3.35,-4.852
3D body: height 0.26, standoff -0.04, extent -4.141,-5.148 -3.85,-4.852
3D body: height 0.26, standoff -0.04, extent -4.641,-5.148 -4.35,-4.852
3D body: height 0.26, standoff -0.04, extent -5.141,-5.148 -4.85,-4.852
3D body: height 0.26, standoff -0.04, extent -5.641,-5.148 -5.35,-4.852
3D body: height 0.26, standoff -0.04, extent 5.359,-5.648 5.65,-5.352
3D body: height 0.26, standoff -0.04, extent 4.859,-5.648 5.15,-5.352
3D body: height 0.26, standoff -0.04, extent 4.359,-5.648 4.65,-5.352
3D body: height 0.26, standoff -0.04, extent 3.859,-5.648 4.15,-5.352
3D body: height 0.26, standoff -0.04, extent 3.359,-5.648 3.65,-5.352
3D body: height 0.26, standoff -0.04, extent 2.359,-5.648 2.65,-5.352
3D body: height 0.26, standoff -0.04, extent 1.859,-5.648 2.15,-5.352
3D body: height 0.26, standoff -0.04, extent 0.859,-5.648 1.15,-5.352
3D body: height 0.26, standoff -0.04, extent 0.359,-5.648 0.65,-5.352
3D body: height 0.26, standoff -0.04, extent -0.641,-5.648 -0.35,-5.352
3D body: height 0.26, standoff -0.04, extent -1.141,-5.648 -0.85,-5.352
3D body: height 0.26, standoff -0.04, extent -2.141,-5.648 -1.85,-5.352
3D body: height 0.26, standoff -0.04, extent -2.641,-5.648 -2.35,-5.352
3D body: height 0.26, standoff -0.04, extent -3.641,-5.648 -3.35,-5.352
3D body: height 0.26, standoff -0.04, extent -4.141,-5.648 -3.85,-5.352
3D body: height 0.26, standoff -0.04, extent -4.641,-5.648 -4.35,-5.352
3D body: height 0.26, standoff -0.04, extent -5.141,-5.648 -4.85,-5.352
3D body: height 0.26, standoff -0.04, extent -5.641,-5.648 -5.35,-5.352
3D body: height 0.26, standoff -0.04, extent -5.648,3.359 -5.352,3.65
3D body: height 0.26, standoff -0.04, extent -5.648,2.359 -5.352,2.65
3D body: height 0.26, standoff -0.04, extent -5.648,1.859 -5.352,2.15
3D body: height 0.26, standoff -0.04, extent -5.648,0.859 -5.352,1.15
3D body: height 0.26, standoff -0.04, extent -5.648,0.359 -5.352,0.65
3D body: height 0.26, standoff -0.04, extent -5.648,-0.641 -5.352,-0.35
3D body: height 0.26, standoff -0.04, extent -5.648,-1.141 -5.352,-0.85
3D body: height 0.26, standoff -0.04, extent -5.648,-2.141 -5.352,-1.85
3D body: height 0.26, standoff -0.04, extent -5.648,-2.641 -5.352,-2.35
3D body: height 0.26, standoff -0.04, extent -5.648,-3.641 -5.352,-3.35
3D body: height 0.26, standoff -0.04, extent -5.148,-3.641 -4.852,-3.35
3D body: height 0.26, standoff -0.04, extent -5.148,-3.141 -4.852,-2.85
3D body: height 0.26, standoff -0.04, extent -5.148,-2.641 -4.852,-2.35
3D body: height 0.26, standoff -0.04, extent -5.148,-2.141 -4.852,-1.85
3D body: height 0.26, standoff -0.04, extent -5.148,-1.641 -4.852,-1.35
3D body: height 0.26, standoff -0.04, extent -5.148,-1.141 -4.852,-0.85
3D body: height 0.26, standoff -0.04, extent -5.148,-0.641 -4.852,-0.35
3D body: height 0.26, standoff -0.04, extent -5.148,-0.141 -4.852,0.15
3D body: height 0.26, standoff -0.04, extent -5.148,0.359 -4.852,0.65
3D body: height 0.26, standoff -0.04, extent -5.148,0.859 -4.852,1.15
3D body: height 0.26, standoff -0.04, extent -5.148,1.359 -4.852,1.65
3D body: height 0.26, standoff -0.04, extent -5.148,1.859 -4.852,2.15
3D body: height 0.26, standoff -0.04, extent -5.148,2.359 -4.852,2.65
3D body: height 0.26, standoff -0.04, extent -5.148,2.859 -4.852,3.15
3D body: height 0.26, standoff -0.04, extent -5.148,3.359 -4.852,3.65
3D body: height 0.26, standoff -0.04, extent -4.648,-3.641 -4.352,-3.35
3D body: height 0.26, standoff -0.04, extent -4.648,-3.141 -4.352,-2.85
3D body: height 0.26, standoff -0.04, extent -4.648,-2.641 -4.352,-2.35
3D body: height 0.26, standoff -0.04, extent -4.648,-2.141 -4.352,-1.85
3D body: height 0.26, standoff -0.04, extent -4.648,-1.641 -4.352,-1.35
3D body: height 0.26, standoff -0.04, extent -4.648,-1.141 -4.352,-0.85
3D body: height 0.26, standoff -0.04, extent -4.648,-0.641 -4.352,-0.35
3D body: height 0.26, standoff -0.04, extent -4.648,-0.141 -4.352,0.15
3D body: height 0.26, standoff -0.04, extent -4.648,0.359 -4.352,0.65
3D body: height 0.26, standoff -0.04, extent -4.648,0.859 -4.352,1.15
3D body: height 0.26, standoff -0.04, extent -4.648,1.359 -4.352,1.65
3D body: height 0.26, standoff -0.04, extent -4.648,1.859 -4.352,2.15
3D body: height 0.26, standoff -0.04, extent -4.648,2.359 -4.352,2.65
3D body: height 0.26, standoff -0.04, extent -4.648,2.859 -4.352,3.15
3D body: height 0.26, standoff -0.04, extent -4.648,3.359 -4.352,3.65
3D body: height 0.26, standoff -0.04, extent -4.148,-3.641 -3.852,-3.35
3D body: height 0.26, standoff -0.04, extent -4.148,-3.141 -3.852,-2.85
3D body: height 0.26, standoff -0.04, extent -4.148,-2.641 -3.852,-2.35
3D body: height 0.26, standoff -0.04, extent -4.148,-2.141 -3.852,-1.85
3D body: height 0.26, standoff -0.04, extent -4.148,-1.641 -3.852,-1.35
3D body: height 0.26, standoff -0.04, extent -4.148,-1.141 -3.852,-0.85
3D body: height 0.26, standoff -0.04, extent -4.148,-0.641 -3.852,-0.35
3D body: height 0.26, standoff -0.04, extent -4.148,-0.141 -3.852,0.15
3D body: height 0.26, standoff -0.04, extent -4.148,0.359 -3.852,0.65
3D body: height 0.26, standoff -0.04, extent -4.148,0.859 -3.852,1.15
3D body: height 0.26, standoff -0.04, extent -4.148,1.359 -3.852,1.65
3D body: height 0.26, standoff -0.04, extent -4.148,1.859 -3.852,2.15
3D body: height 0.26, standoff -0.04, extent -4.148,2.359 -3.852,2.65
3D body: height 0.26, standoff -0.04, extent -4.148,2.859 -3.852,3.15
3D body: height 0.26, standoff -0.04, extent -4.148,3.359 -3.852,3.65
3D body: height 0.26, standoff -0.04, extent 5.352,-3.641 5.648,-3.35
3D body: height 0.26, standoff -0.04, extent 5.352,-2.641 5.648,-2.35
3D body: height 0.26, standoff -0.04, extent 5.352,-2.141 5.648,-1.85
3D body: height 0.26, standoff -0.04, extent 5.352,-1.141 5.648,-0.85
3D body: height 0.26, standoff -0.04, extent 5.352,-0.641 5.648,-0.35
3D body: height 0.26, standoff -0.04, extent 5.352,0.359 5.648,0.65
3D body: height 0.26, standoff -0.04, extent 5.352,0.859 5.648,1.15
3D body: height 0.26, standoff -0.04, extent 5.352,1.859 5.648,2.15
3D body: height 0.26, standoff -0.04, extent 5.352,2.359 5.648,2.65
3D body: height 0.26, standoff -0.04, extent 5.352,3.359 5.648,3.65
3D body: height 0.26, standoff -0.04, extent 4.852,-3.641 5.148,-3.35
3D body: height 0.26, standoff -0.04, extent 4.852,-3.141 5.148,-2.85
3D body: height 0.26, standoff -0.04, extent 4.852,-2.641 5.148,-2.35
3D body: height 0.26, standoff -0.04, extent 4.852,-2.141 5.148,-1.85
3D body: height 0.26, standoff -0.04, extent 4.852,-1.641 5.148,-1.35
3D body: height 0.26, standoff -0.04, extent 4.852,-1.141 5.148,-0.85
3D body: height 0.26, standoff -0.04, extent 4.852,-0.641 5.148,-0.35
3D body: height 0.26, standoff -0.04, extent 4.852,-0.141 5.148,0.15
3D body: height 0.26, standoff -0.04, extent 4.852,0.359 5.148,0.65
3D body: height 0.26, standoff -0.04, extent 4.852,0.859 5.148,1.15
3D body: height 0.26, standoff -0.04, extent 4.852,1.359 5.148,1.65
3D body: height 0.26, standoff -0.04, extent 4.852,1.859 5.148,2.15
3D body: height 0.26, standoff -0.04, extent 4.852,2.359 5.148,2.65
3D body: height 0.26, standoff -0.04, extent 4.852,2.859 5.148,3.15
3D body: height 0.26, standoff -0.04, extent 4.852,3.359 5.148,3.65
3D body: height 0.26, standoff -0.04, extent 4.352,-3.641 4.648,-3.35
3D body: height 0.26, standoff -0.04, extent 4.352,-3.141 4.648,-2.85
3D body: height 0.26, standoff -0.04, extent 4.352,-2.641 4.648,-2.35
3D body: height 0.26, standoff -0.04, extent 4.352,-2.141 4.648,-1.85
3D body: height 0.26, standoff -0.04, extent 4.352,-1.641 4.648,-1.35
3D body: height 0.26, standoff -0.04, extent 4.352,-1.141 4.648,-0.85
3D body: height 0.26, standoff -0.04, extent 4.352,-0.641 4.648,-0.35
3D body: height 0.26, standoff -0.04, extent 4.352,-0.141 4.648,0.15
3D body: height 0.26, standoff -0.04, extent 4.352,0.359 4.648,0.65
3D body: height 0.26, standoff -0.04, extent 4.352,0.859 4.648,1.15
3D body: height 0.26, standoff -0.04, extent 4.352,1.359 4.648,1.65
3D body: height 0.26, standoff -0.04, extent 4.352,1.859 4.648,2.15
3D body: height 0.26, standoff -0.04, extent 4.352,2.359 4.648,2.65
3D body: height 0.26, standoff -0.04, extent 4.352,2.859 4.648,3.15
3D body: height 0.26, standoff -0.04, extent 4.352,3.359 4.648,3.65
3D body: height 0.26, standoff -0.04, extent 3.852,-3.641 4.148,-3.35
3D body: height 0.26, standoff -0.04, extent 3.852,-3.141 4.148,-2.85
3D body: height 0.26, standoff -0.04, extent 3.852,-2.641 4.148,-2.35
3D body: height 0.26, standoff -0.04, extent 3.852,-2.141 4.148,-1.85
3D body: height 0.26, standoff -0.04, extent 3.852,-1.641 4.148,-1.35
3D body: height 0.26, standoff -0.04, extent 3.852,-1.141 4.148,-0.85
3D body: height 0.26, standoff -0.04, extent 3.852,-0.641 4.148,-0.35
3D body: height 0.26, standoff -0.04, extent 3.852,-0.141 4.148,0.15
3D body: height 0.26, standoff -0.04, extent 3.852,0.359 4.148,0.65
3D body: height 0.26, standoff -0.04, extent 3.852,0.859 4.148,1.15
3D body: height 0.26, standoff -0.04, extent 3.852,1.359 4.148,1.65
3D body: height 0.26, standoff -0.04, extent 3.852,1.859 4.148,2.15
3D body: height 0.26, standoff -0.04, extent 3.852,2.359 4.148,2.65
3D body: height 0.26, standoff -0.04, extent 3.852,2.859 4.148,3.15
3D body: height 0.26, standoff -0.04, extent 3.852,3.359 4.148,3.65
3D body: height 1.2, standoff 0.2, extent -6.075,-6.075 6.075,6.075
3D body: height 1.21, standoff 1.2, extent -5.798,5.201 -5.2,5.799

## TO3 [mm]
pads (4):
  round 3 hole 1.3: 1(-1.778,-5.461) 2(-1.778,5.461)
  oval 6x5 hole 4.2: 3(-15.113,0) 3(15.113,0)
Top Overlay:
  circle w0.254: c0,0 r10.5
  lines w0.254: -19.82,-0.051 ccw(c-15.22,-0.051) -17.773,-3.877 -7.246,-10.902 ccw(c-0.03,-0.089) -0.03,-13.089 -0.02,-13.089 ccw(c-0.02,-0.089) 7.196,-10.902 17.723,-3.877 ccw(c15.17,-0.051) 19.77,-0.051 19.77,0.051 ccw(c15.17,0.051) 17.723,3.877 7.196,10.902 ccw(c-0.02,0.089) -0.02,13.089 -0.03,13.089 ccw(c-0.03,0.089) -7.246,10.902 -17.773,3.877 ccw(c-15.22,0.051) -19.82,0.051 -19.82,-0.051
3D body "User Library-TO-3_Long.STEP": height 8.5, standoff -12, extent -19.757,-13.089 19.833,13.089

## TO3-5 [mm]
pads (5):
  rect 2.2x2.2 hole 1.4: 1(0,0)
  round 2.2 hole 1.4: 2(3.81,0) 3(6.35,0) 4(8.89,0) 5(11.43,0)
Top Overlay:
  circle w0.4: c-2.8,0 r0.2
  lines w0.254: -2.085,2.6 13.515,2.6 ; -2.085,-1.65 -2.085,3.15 13.515,3.15 13.515,-1.65 -2.085,-1.65

## TO3A [mm]
pads (3):
  rect 3x2.5 hole 1.6: 1(-5.45,0)
  oval 3x2.5 hole 1.6: 2(0,0) 3(5.45,0)
Top Overlay:
  circle w0.4: c-5.4,-2.1 r0.2
  lines w0.254: -7.8,1.7 7.8,1.7 ; -7.8,-2.8 -7.8,2.2 7.8,2.2 7.8,-2.8 -7.8,-2.8
3D body "TO-3P.STEP": height 24.4, standoff -15.5, extent -7.9,-2.9 7.7,1.81